# Altium footprint library En.PcbLib: 240 footprints (part 6 of 15)
Each footprint in its own frame and in the unit in brackets; x right, y up, seen from the top. Pads: shape width x height; smd on the part's side, far side on the other; paste and mask are expansions set on the pad; w line width, h text height; cw(c..) or ccw(c..) is an arc to the next point about the centre after c.
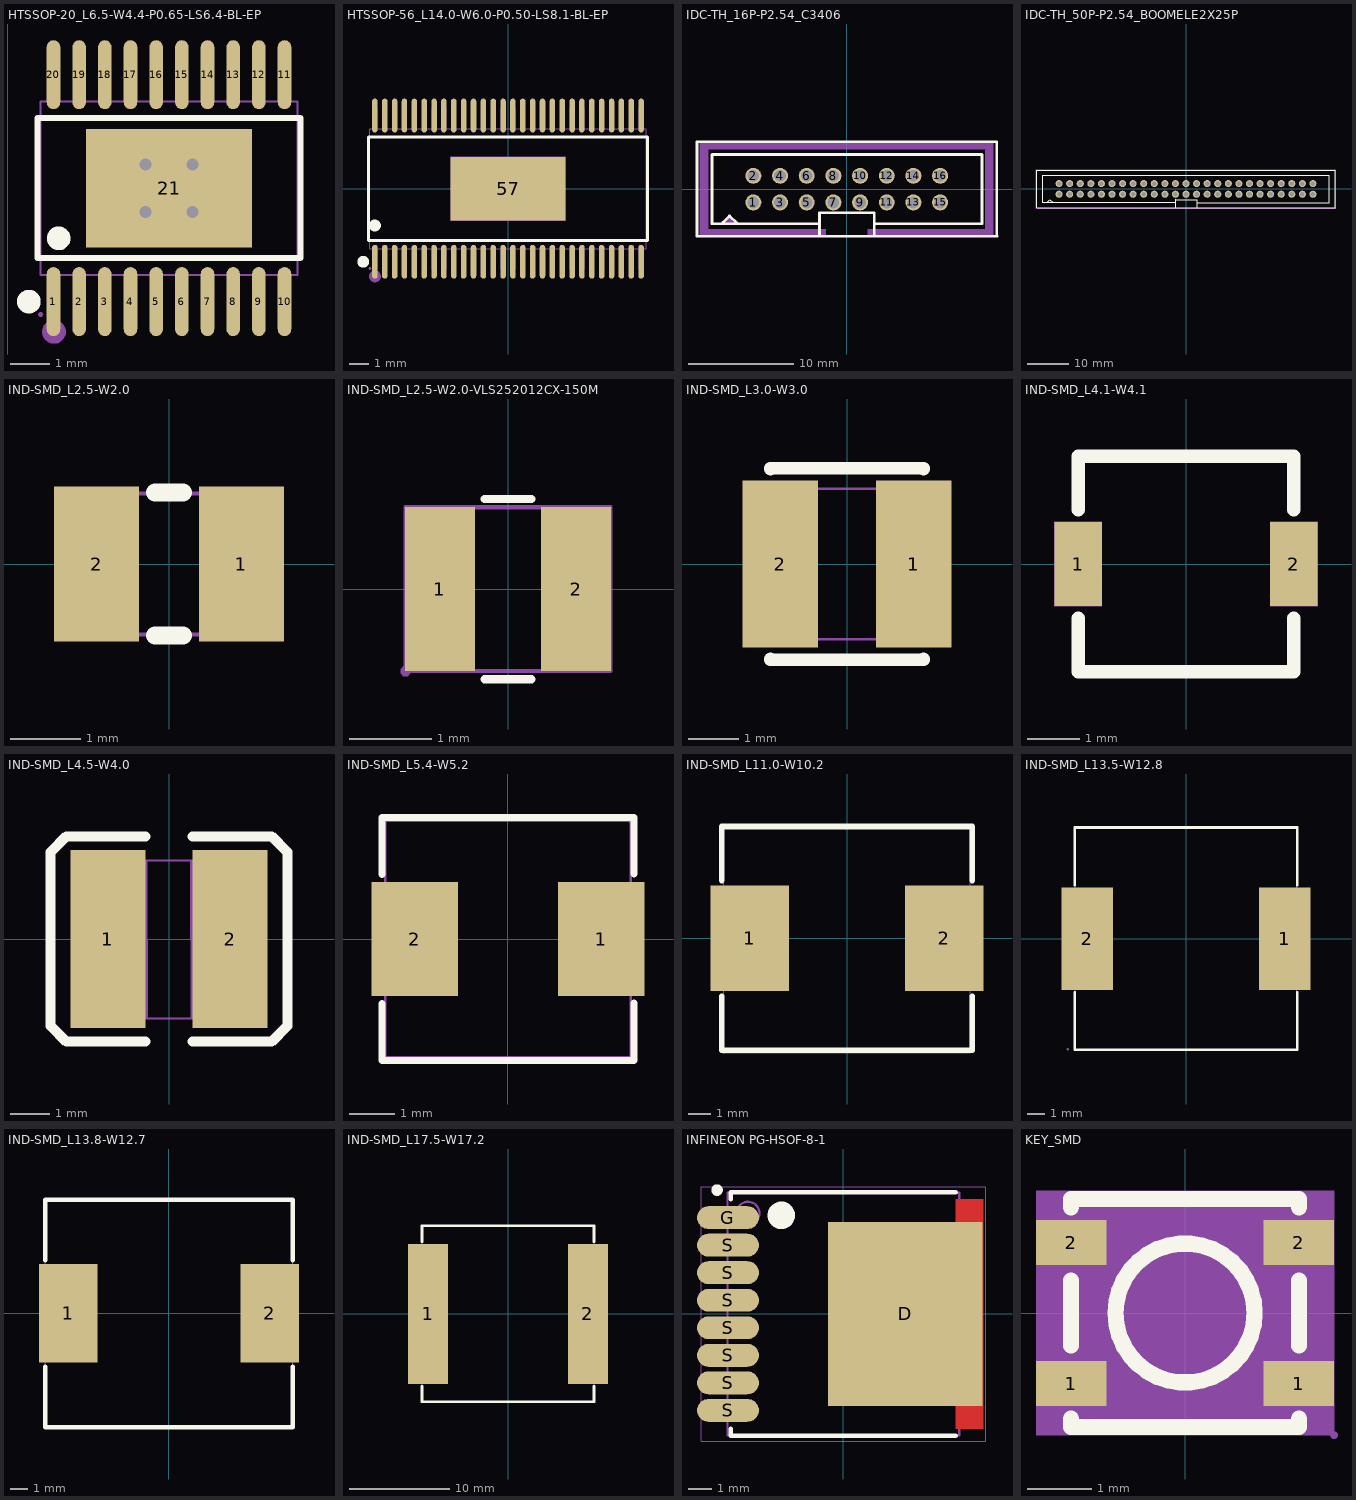
[diagram p5: the footprints below, top view; thin cyan lines are the x and y axes]

## HTSSOP-20_L6.5-W4.4-P0.65-LS6.4-BL-EP [mm]
pads (21):
  oval 0.343x1.747 smd: 1(1.155,-8.356) 2(1.805,-8.356) 3(2.455,-8.356) 4(3.105,-8.356) 5(3.755,-8.356) 6(4.405,-8.356) 7(5.055,-8.356) 8(5.705,-8.356) 9(6.355,-8.356) 10(7.005,-8.356) 11(7.005,-2.61) 12(6.355,-2.61) 13(5.705,-2.61) 14(5.055,-2.61) 15(4.405,-2.61) 16(3.755,-2.61) 17(3.105,-2.61) 18(2.455,-2.61) 19(1.805,-2.61) 20(1.155,-2.61)
  rect 4.2x3 smd: 21(4.08,-5.483)
via 4.68,-4.883 diameter 0.61 hole 0.305
via 3.48,-4.883 diameter 0.61 hole 0.305
via 3.48,-6.083 diameter 0.61 hole 0.305
via 4.68,-6.083 diameter 0.61 hole 0.305
Top Overlay:
  circle w0.3: c0.531,-8.356 r0.15
  circle w0.3: c1.286,-6.753 r0.15
  lines w0.152: 0.754,-7.254 0.754,-3.711 7.406,-3.711 7.406,-7.254 0.754,-7.254
Mechanical 6:
  circle w0.3: c1.168,-9.121 r0.15
Mechanical 15:
  drawing of 46 lines, arcs and shapes, not listed
3D body "User Library-HTSSOP20.sldprt": height 0.95, standoff -0.06, extent 0.838,-8.694 7.338,-2.28

## HTSSOP-56_L14.0-W6.0-P0.50-LS8.1-BL-EP [mm]
pads (57):
  oval 0.28x1.715 smd: 1(-6.75,-3.708) 2(-6.25,-3.708) 3(-5.75,-3.708) 4(-5.25,-3.708) 5(-4.75,-3.708) 6(-4.25,-3.708) 7(-3.75,-3.708) 8(-3.25,-3.708) 9(-2.75,-3.708) 10(-2.25,-3.708) 11(-1.75,-3.708) 12(-1.25,-3.708) 13(-0.75,-3.708) 14(-0.25,-3.708) 15(0.25,-3.708) 16(0.75,-3.708) 17(1.25,-3.708) 18(1.75,-3.708) 19(2.25,-3.708) 20(2.75,-3.708) 21(3.25,-3.708) 22(3.75,-3.708) 23(4.25,-3.708) 24(4.75,-3.708) 25(5.25,-3.708) 26(5.75,-3.708) 27(6.25,-3.708) 28(6.75,-3.708) 29(6.75,3.708) 30(6.25,3.708) 31(5.75,3.708) 32(5.25,3.708) 33(4.75,3.708) 34(4.25,3.708) 35(3.75,3.708) 36(3.25,3.708) 37(2.75,3.708) 38(2.25,3.708) 39(1.75,3.708) 40(1.25,3.708) 41(0.75,3.708) 42(0.25,3.708) 43(-0.25,3.708) 44(-0.75,3.708) 45(-1.25,3.708) 46(-1.75,3.708) 47(-2.25,3.708) 48(-2.75,3.708) 49(-3.25,3.708) 50(-3.75,3.708) 51(-4.25,3.708) 52(-4.75,3.708) 53(-5.25,3.708) 54(-5.75,3.708) 55(-6.25,3.708) 56(-6.75,3.708)
  rect 5.825x3.235 smd: 57(0,0)
Top Overlay:
  circle w0.3: c-6.75,-1.869 r0.15
  circle w0.3: c-7.342,-3.708 r0.15
  lines w0.152: -7.076,-2.621 -7.076,2.622 7.076,2.622 7.076,-2.621 -7.076,-2.621
Mechanical 6:
  circle w0.3: c-6.75,-4.45 r0.15
Mechanical 15:
  drawing of 118 lines, arcs and shapes, not listed
3D body "User Library-HTSSOP-56_leg_TSSOP56.SLDPRT": height 0.7, standoff 0, extent 6.09,-4.056 6.35,-3.056
3D body "User Library-HTSSOP-56_leg_TSSOP56.SLDPRT": height 0.7, standoff 0, extent 5.588,-4.056 5.848,-3.056
3D body "User Library-HTSSOP-56_leg_TSSOP56.SLDPRT": height 0.7, standoff 0, extent 5.087,-4.056 5.347,-3.056
3D body "User Library-HTSSOP-56_leg_TSSOP56.SLDPRT": height 0.7, standoff 0, extent 4.589,-4.056 4.849,-3.056
3D body "User Library-HTSSOP-56_leg_TSSOP56.SLDPRT": height 0.7, standoff 0, extent 4.09,-4.056 4.35,-3.056
3D body "User Library-HTSSOP-56_leg_TSSOP56.SLDPRT": height 0.7, standoff 0, extent 3.592,-4.056 3.852,-3.056
3D body "User Library-HTSSOP-56_leg_TSSOP56.SLDPRT": height 0.7, standoff 0, extent 3.093,-4.056 3.353,-3.056
3D body "User Library-HTSSOP-56_leg_TSSOP56.SLDPRT": height 0.7, standoff 0, extent 2.594,-4.056 2.854,-3.056
3D body "User Library-HTSSOP-56_leg_TSSOP56.SLDPRT": height 0.7, standoff 0, extent 2.096,-4.056 2.356,-3.056
3D body "User Library-HTSSOP-56_leg_TSSOP56.SLDPRT": height 0.7, standoff 0, extent 1.597,-4.056 1.857,-3.056
3D body "User Library-HTSSOP-56_leg_TSSOP56.SLDPRT": height 0.7, standoff 0, extent 1.099,-4.056 1.359,-3.056
3D body "User Library-HTSSOP-56_leg_TSSOP56.SLDPRT": height 0.7, standoff 0, extent 0.6,-4.056 0.86,-3.056
3D body "User Library-HTSSOP-56_leg_TSSOP56.SLDPRT": height 0.7, standoff 0, extent 0.102,-4.056 0.362,-3.056
3D body "User Library-HTSSOP-56_leg_TSSOP56.SLDPRT": height 0.7, standoff 0, extent -0.397,-4.056 -0.137,-3.056
3D body "User Library-HTSSOP-56_leg_TSSOP56.SLDPRT": height 0.7, standoff 0, extent -0.896,-4.056 -0.636,-3.056
3D body "User Library-HTSSOP-56_leg_TSSOP56.SLDPRT": height 0.7, standoff 0, extent -1.394,-4.056 -1.134,-3.056
3D body "User Library-HTSSOP-56_leg_TSSOP56.SLDPRT": height 0.7, standoff 0, extent -1.893,-4.056 -1.633,-3.056
3D body "User Library-HTSSOP-56_leg_TSSOP56.SLDPRT": height 0.7, standoff 0, extent -2.391,-4.056 -2.131,-3.056
3D body "User Library-HTSSOP-56_leg_TSSOP56.SLDPRT": height 0.7, standoff 0, extent -2.89,-4.056 -2.63,-3.056
3D body "User Library-HTSSOP-56_leg_TSSOP56.SLDPRT": height 0.7, standoff 0, extent -3.389,-4.056 -3.129,-3.056
3D body "User Library-HTSSOP-56_leg_TSSOP56.SLDPRT": height 0.7, standoff 0, extent -3.887,-4.056 -3.627,-3.056
3D body "User Library-HTSSOP-56_leg_TSSOP56.SLDPRT": height 0.7, standoff 0, extent -4.386,-4.056 -4.126,-3.056
3D body "User Library-HTSSOP-56_leg_TSSOP56.SLDPRT": height 0.7, standoff 0, extent -4.884,-4.056 -4.624,-3.056
3D body "User Library-HTSSOP-56_leg_TSSOP56.SLDPRT": height 0.7, standoff 0, extent -5.383,-4.056 -5.123,-3.056
3D body "User Library-HTSSOP-56_leg_TSSOP56.SLDPRT": height 0.7, standoff 0, extent -5.882,-4.056 -5.622,-3.056
3D body "User Library-HTSSOP-56_leg_TSSOP56.SLDPRT": height 0.7, standoff 0, extent -6.38,-4.056 -6.12,-3.056
3D body "User Library-HTSSOP-56_leg_TSSOP56.SLDPRT": height 0.7, standoff 0, extent -6.879,-4.056 -6.619,-3.056
3D body "User Library-HTSSOP-56_leg_TSSOP56.SLDPRT": height 0.7, standoff 0, extent 6.598,-4.056 6.858,-3.056
3D body "User Library-HTSSOP-56_leg_TSSOP56.SLDPRT": height 0.7, standoff 0, extent -6.35,3.056 -6.09,4.056
3D body "User Library-HTSSOP-56_leg_TSSOP56.SLDPRT": height 0.7, standoff 0, extent -5.848,3.056 -5.588,4.056
3D body "User Library-HTSSOP-56_leg_TSSOP56.SLDPRT": height 0.7, standoff 0, extent -5.347,3.056 -5.087,4.056
3D body "User Library-HTSSOP-56_leg_TSSOP56.SLDPRT": height 0.7, standoff 0, extent -4.849,3.056 -4.589,4.056
3D body "User Library-HTSSOP-56_leg_TSSOP56.SLDPRT": height 0.7, standoff 0, extent -4.35,3.056 -4.09,4.056
3D body "User Library-HTSSOP-56_leg_TSSOP56.SLDPRT": height 0.7, standoff 0, extent -3.852,3.056 -3.592,4.056
3D body "User Library-HTSSOP-56_leg_TSSOP56.SLDPRT": height 0.7, standoff 0, extent -3.353,3.056 -3.093,4.056
3D body "User Library-HTSSOP-56_leg_TSSOP56.SLDPRT": height 0.7, standoff 0, extent -2.854,3.056 -2.594,4.056
3D body "User Library-HTSSOP-56_leg_TSSOP56.SLDPRT": height 0.7, standoff 0, extent -2.356,3.056 -2.096,4.056
3D body "User Library-HTSSOP-56_leg_TSSOP56.SLDPRT": height 0.7, standoff 0, extent -1.857,3.056 -1.597,4.056
3D body "User Library-HTSSOP-56_leg_TSSOP56.SLDPRT": height 0.7, standoff 0, extent -1.359,3.056 -1.099,4.056
3D body "User Library-HTSSOP-56_leg_TSSOP56.SLDPRT": height 0.7, standoff 0, extent -0.86,3.056 -0.6,4.056
3D body "User Library-HTSSOP-56_leg_TSSOP56.SLDPRT": height 0.7, standoff 0, extent -0.362,3.056 -0.102,4.056
3D body "User Library-HTSSOP-56_leg_TSSOP56.SLDPRT": height 0.7, standoff 0, extent 0.137,3.056 0.397,4.056
3D body "User Library-HTSSOP-56_leg_TSSOP56.SLDPRT": height 0.7, standoff 0, extent 0.636,3.056 0.896,4.056
3D body "User Library-HTSSOP-56_leg_TSSOP56.SLDPRT": height 0.7, standoff 0, extent 1.134,3.056 1.394,4.056
3D body "User Library-HTSSOP-56_leg_TSSOP56.SLDPRT": height 0.7, standoff 0, extent 1.633,3.056 1.893,4.056
3D body "User Library-HTSSOP-56_leg_TSSOP56.SLDPRT": height 0.7, standoff 0, extent 2.131,3.056 2.391,4.056
3D body "User Library-HTSSOP-56_leg_TSSOP56.SLDPRT": height 0.7, standoff 0, extent 2.63,3.056 2.89,4.056
3D body "User Library-HTSSOP-56_leg_TSSOP56.SLDPRT": height 0.7, standoff 0, extent 3.129,3.056 3.389,4.056
3D body "User Library-HTSSOP-56_leg_TSSOP56.SLDPRT": height 0.7, standoff 0, extent 3.627,3.056 3.887,4.056
3D body "User Library-HTSSOP-56_leg_TSSOP56.SLDPRT": height 0.7, standoff 0, extent 4.126,3.056 4.386,4.056
3D body "User Library-HTSSOP-56_leg_TSSOP56.SLDPRT": height 0.7, standoff 0, extent 4.624,3.056 4.884,4.056
3D body "User Library-HTSSOP-56_leg_TSSOP56.SLDPRT": height 0.7, standoff 0, extent 5.123,3.056 5.383,4.056
3D body "User Library-HTSSOP-56_leg_TSSOP56.SLDPRT": height 0.7, standoff 0, extent 5.622,3.056 5.882,4.056
3D body "User Library-HTSSOP-56_leg_TSSOP56.SLDPRT": height 0.7, standoff 0, extent 6.12,3.056 6.38,4.056
3D body "User Library-HTSSOP-56_leg_TSSOP56.SLDPRT": height 0.7, standoff 0, extent 6.619,3.056 6.879,4.056
3D body "User Library-HTSSOP-56_leg_TSSOP56.SLDPRT": height 0.7, standoff 0, extent -6.858,3.056 -6.598,4.056
3D body "User Library-HTSSOP-56_Part_HTSSOP56.SLDPRT": height 0.99, standoff -0.01, extent -7,-3.1 7,3.1

## IDC-TH_16P-P2.54_C3406 [mil]
pads (16):
  round 60 hole 43.3: 1(-350,-50) 2(-350,50) 3(-250,-50) 4(-250,50) 5(-150,-50) 6(-150,50) 7(-50,-50) 8(-50,50) 9(50,-50) 10(50,50) 11(150,-50) 12(150,50) 13(250,-50) 14(250,50) 15(350,-50) 16(350,50)
Top Overlay:
  lines w10: -561,-176.33 -561,178 ; -559.9,178 562.2,178 ; -558.9,-177 562.99,-177 ; -505,-130 -103,-130 -102,-129 ; -505,-129 -505,129.66 ; -504.66,130 507.09,130 ; -464,-125 -439,-100 -412,-127 -412,-128 ; -102,-176 -102,-91 ; -102,-89 103,-89 103,-176 104,-177 ; 104,-131 104,-130 507,-130 ; 507,-129 507,129.66 ; 562,-176.33 562,178
Mechanical 6:
  region: -465,-130 -412,-130 -439,-100
  region: -78.74,-173.23 -549.61,-173.23 -549.61,173.23 549.61,173.23 549.61,-173.23 78.74,-173.23 78.74,-170.08 78.74,-157.87 78.74,-149.61 519.68,-149.61 519.68,149.61 -519.68,149.61 -519.68,-149.61 -78.74,-149.61
Mechanical 15:
  region: -547.25,-173.23 -547.27,-172.27 -548.65,-170.92 -550.57,-170.92 -551.95,-172.27 -551.97,-173.23 -551.95,-174.19 -550.57,-175.54 -548.65,-175.54 -547.27,-174.19
  region: 337.4,62.6 362.6,62.6 362.6,37.4 337.4,37.4
  region: 337.4,-37.4 362.6,-37.4 362.6,-62.6 337.4,-62.6
  region: 237.4,62.6 262.6,62.6 262.6,37.4 237.4,37.4
  region: 237.4,-37.4 262.6,-37.4 262.6,-62.6 237.4,-62.6
  region: 137.4,62.6 162.6,62.6 162.6,37.4 137.4,37.4
  region: 137.4,-37.4 162.6,-37.4 162.6,-62.6 137.4,-62.6
  region: 37.4,62.6 62.6,62.6 62.6,37.4 37.4,37.4
  region: 37.4,-37.4 62.6,-37.4 62.6,-62.6 37.4,-62.6
  region: -62.6,62.6 -37.4,62.6 -37.4,37.4 -62.6,37.4
  region: -62.6,-37.4 -37.4,-37.4 -37.4,-62.6 -62.6,-62.6
  region: -162.6,62.6 -137.4,62.6 -137.4,37.4 -162.6,37.4
  region: -162.6,-37.4 -137.4,-37.4 -137.4,-62.6 -162.6,-62.6
  region: -262.6,62.6 -237.4,62.6 -237.4,37.4 -262.6,37.4
  region: -262.6,-37.4 -237.4,-37.4 -237.4,-62.6 -262.6,-62.6
  region: -362.6,62.6 -337.4,62.6 -337.4,37.4 -362.6,37.4
  region: -362.6,-37.4 -337.4,-37.4 -337.4,-62.6 -362.6,-62.6
  lines w2: -549.61,-173.23 -549.61,173.23 549.61,173.23 549.61,-173.23 -549.61,-173.23
3D body "dc3-2.54-16pas.step": height 346.46, standoff -137.8, extent -547.19,-171.07 552.03,179.36

## IDC-TH_50P-P2.54_BOOMELE2X25P [mm]
pads (50):
  round 1.7 hole 1.1: 1(-30.48,-1.27) 2(-30.48,1.27) 3(-27.94,-1.27) 4(-27.94,1.27) 5(-25.4,-1.27) 6(-25.4,1.27) 7(-22.86,-1.27) 8(-22.86,1.27) 9(-20.32,-1.27) 10(-20.32,1.27) 11(-17.78,-1.27) 12(-17.78,1.27) 13(-15.24,-1.27) 14(-15.24,1.27) 15(-12.7,-1.27) 16(-12.7,1.27) 17(-10.16,-1.27) 18(-10.16,1.27) 19(-7.62,-1.27) 20(-7.62,1.27) 21(-5.08,-1.27) 22(-5.08,1.27) 23(-2.54,-1.27) 24(-2.54,1.27) 25(0,-1.27) 26(0,1.27) 27(2.54,-1.27) 28(2.54,1.27) 29(5.08,-1.27) 30(5.08,1.27) 31(7.62,-1.27) 32(7.62,1.27) 33(10.16,-1.27) 34(10.16,1.27) 35(12.7,-1.27) 36(12.7,1.27) 37(15.24,-1.27) 38(15.24,1.27) 39(17.78,-1.27) 40(17.78,1.27) 41(20.32,-1.27) 42(20.32,1.27) 43(22.86,-1.27) 44(22.86,1.27) 45(25.4,-1.27) 46(25.4,1.27) 47(27.94,-1.27) 48(27.94,1.27) 49(30.48,-1.27) 50(30.48,1.27)
Top Overlay:
  lines w0.254: -35.839,-4.479 -35.839,4.521 ; -35.811,4.521 35.789,4.521 ; -35.786,-4.496 35.814,-4.496 ; -34.442,-3.251 -2.565,-3.251 -2.54,-3.277 ; -34.417,-3.277 -34.417,3.293 ; -34.408,3.302 34.392,3.302 ; -33.376,-3.175 -32.741,-2.54 -32.055,-3.226 -32.055,-3.251 ; -2.515,-4.496 -2.515,-2.515 -2.515,-2.54 2.692,-2.54 2.692,-4.496 2.692,-4.394 ; 2.692,-3.277 34.366,-3.277 34.392,-3.277 34.392,3.293 ; 35.89,-4.479 35.89,4.521
Mechanical 15:
  drawing of 55 lines, arcs and shapes, not listed
3D body "2.54-2_25p简牛.step": height 8.75, standoff -3.65, extent -35.53,-4.191 35.59,4.71

## IND-SMD_L2.5-W2.0 [mm]
pads (2):
  rect 1.2x2.2 smd: 1(1.028,0) 2(-1.028,0)
Top Overlay:
  lines w0.254: -0.197,-1.016 0.197,-1.016 ; -0.197,1.016 0.197,1.016
Mechanical 15:
  region: -1.25,1 -0.45,1 -0.45,-1 -1.25,-1
  region: 0.45,1 1.25,1 1.25,-1 0.45,-1
  region: -1.16,-0.97 -1.161,-0.946 -1.196,-0.912 -1.244,-0.912 -1.279,-0.946 -1.28,-0.97 -1.279,-0.994 -1.244,-1.028 -1.196,-1.028 -1.161,-0.994
  lines w0.051: -1.25,-1 -1.25,1 1.25,1 1.25,-1 -1.25,-1
3D body "fhd252012s-2r2mt.step": height 1.2, standoff 0, extent -1.26,-1 1.26,1

## IND-SMD_L2.5-W2.0-VLS252012CX-150M [mm]
pads (2):
  rect 0.85x2 smd: 1(-0.83,0) 2(0.83,0)
Top Overlay:
  lines w0.102: -0.288,-1.1 0.287,-1.1 ; -0.288,1.1 0.287,1.1
Mechanical 15:
  region: -1.19,-1 -1.19,-0.975 -1.225,-0.94 -1.275,-0.94 -1.31,-0.975 -1.31,-1 -1.31,-1.025 -1.275,-1.06 -1.225,-1.06 -1.19,-1.025
  region: -1.23,1 -0.43,1 -0.43,-1 -1.23,-1
  region: 0.43,1 1.23,1 1.23,-1 0.43,-1
  lines w0.051: -1.25,-1 -1.25,1 1.25,1 1.25,-1 -1.25,-1
3D body "ftc252010s4r7mbca.step": height 1.21, standoff 0, extent -1.251,-1.001 1.251,1.001

## IND-SMD_L3.0-W3.0 [mm]
pads (2):
  rect 1.5x3.32 smd: 1(1.328,0) 2(-1.328,0)
Top Overlay:
  lines w0.254: -1.524,-1.891 -1.524,-1.905 1.524,-1.905 1.524,-1.891 ; -1.524,1.891 -1.524,1.905 1.524,1.905 1.524,1.891
Mechanical 15:
  region: -1.5,-1.45 -1.5,1.45 -0.75,1.45 -0.75,-1.45
  region: 1.5,-1.45 1.5,1.45 0.75,1.45 0.75,-1.45
  region: -1.44,-1.5 -1.44,-1.475 -1.475,-1.44 -1.525,-1.44 -1.56,-1.475 -1.56,-1.5 -1.56,-1.525 -1.525,-1.56 -1.475,-1.56 -1.44,-1.525
  lines w0.051: -1.5,-1.5 -1.5,1.5 1.5,1.5 1.5,-1.5 -1.5,-1.5
3D body "User Library-nr3015.SLDPRT": height 1.35, standoff -0.14, extent -1.5,-1.5 1.5,1.5

## IND-SMD_L4.1-W4.1 [mm]
pads (2):
  rect 0.9x1.6 smd: 1(-2.05,0) 2(2.05,0)
Top Overlay:
  lines w0.254: -2.05,-1.031 -2.05,-2.05 2.05,-2.05 2.05,-1.031 ; -2.05,1.031 -2.05,2.05 2.05,2.05 2.05,1.031
Mechanical 15:
  region: -2.5,0.8 -1.6,0.8 -1.6,-0.8 -2.5,-0.8
  region: 1.6,0.8 2.5,0.8 2.5,-0.8 1.6,-0.8
3D body "xr0420-220m.step": height 2.1, standoff 0, extent -2.2,-2.1 2.2,2.1

## IND-SMD_L4.5-W4.0 [mm]
pads (2):
  rect 1.9x4.5 smd: 1(-1.55,0) 2(1.55,0)
Top Overlay:
  lines w0.254: -0.599,-2.601 -2.601,-2.601 -3,-2.2 -3,2.2 -2.601,2.601 -0.599,2.601 ; 0.599,-2.601 2.601,-2.601 3,-2.2 3,2.2 2.601,2.601 0.599,2.601
Mechanical 15:
  drawing of 84 lines, arcs and shapes, not listed
3D body "cd43n-220m.step": height 3.21, standoff -0.01, extent -2.163,-2 2.161,2

## IND-SMD_L5.4-W5.2 [mm]
pads (2):
  rect 1.9x2.5 smd: 1(2.05,0) 2(-2.05,0)
Top Overlay:
  lines w0.152: -2.775,-1.42 -2.776,-2.676 2.776,-2.676 2.775,-1.41 ; -2.775,1.42 -2.776,2.676 2.776,2.676 2.775,1.43
Mechanical 15:
  region: -2.7,1.05 -1.5,1.05 -1.5,-1.05 -2.7,-1.05
  region: 1.5,1.05 2.7,1.05 2.7,-1.05 1.5,-1.05
  region: 2.76,2.6 2.759,2.624 2.724,2.658 2.676,2.658 2.641,2.624 2.64,2.6 2.641,2.576 2.676,2.542 2.724,2.542 2.759,2.576
  lines w0.051: -2.7,-2.6 2.7,-2.6 2.7,2.6 -2.7,2.6 -2.7,-2.6
3D body "xr0530-100m.step": height 3.1, standoff 0, extent -2.7,-2.6 2.7,2.6

## IND-SMD_L11.0-W10.2 [mm]
pads (2):
  rect 3.5x4.7 smd: 1(-4.35,0) 2(4.35,0)
Top Overlay:
  lines w0.254: -5.6,-2.581 -5.6,-5 5.6,-5 5.6,-2.581 ; -5.6,2.581 -5.6,5 5.6,5 5.6,2.581
Mechanical 15:
  region: 5.5,1.5 5.5,-1.5 3.5,-1.5 3.5,1.5
  region: -3.5,1.5 -3.5,-1.5 -5.5,-1.5 -5.5,1.5
  region: -5.44,-5.1 -5.441,-5.076 -5.476,-5.042 -5.524,-5.042 -5.559,-5.076 -5.56,-5.1 -5.559,-5.124 -5.524,-5.158 -5.476,-5.158 -5.441,-5.124
  lines w0.051: -5.5,-5.1 -5.5,5.1 5.5,5.1 5.5,-5.1 -5.5,-5.1
3D body "cxp1050-4r7m-ag(4.7uh).step": height 4, standoff -0.01, extent -5.5,-5.1 5.5,5.1

## IND-SMD_L13.5-W12.8 [mm]
pads (2):
  rect 2.924x5.82 smd: 1(5.628,0) 2(-5.628,0)
Top Overlay:
  lines w0.152: -6.326,-3.062 -6.326,-6.326 6.326,-6.326 6.326,-3.062 ; -6.326,3.062 -6.326,6.326 6.326,6.326 6.326,3.062
Mechanical 15:
  region: -6.665,-6.3 -6.666,-6.276 -6.701,-6.243 -6.749,-6.243 -6.784,-6.276 -6.785,-6.3 -6.784,-6.324 -6.749,-6.357 -6.701,-6.357 -6.666,-6.324
  region: -6.725,1.925 -4.75,1.925 -4.75,-1.925 -6.725,-1.925
  region: 4.75,1.925 6.725,1.925 6.725,-1.925 4.75,-1.925
  lines w0.051: -6.3,-6.3 -6.3,6.3 6.3,6.3 6.3,-6.3 -6.3,-6.3
3D body "cxp1250-4r7m-hg(4.7uh).step": height 6.6, standoff -0.05, extent -6.75,-6.4 6.75,6.4

## IND-SMD_L13.8-W12.7 [mm]
pads (2):
  rect 3.25x5.5 smd paste+0 mask+0.05: 1(-5.625,0) 2(5.625,0)
Top Overlay:
  lines w0.254: -6.9,-2.981 -6.9,-6.35 6.9,-6.35 6.9,-2.981 ; -6.9,2.981 -6.9,6.35 6.9,6.35 6.9,2.981
Mechanical 15:
  region: -6.84,-6.35 -6.841,-6.326 -6.876,-6.293 -6.924,-6.293 -6.959,-6.326 -6.96,-6.35 -6.959,-6.374 -6.924,-6.407 -6.876,-6.407 -6.841,-6.374
  region: 4.6,2.5 6.9,2.5 6.9,-2.5 4.6,-2.5
  region: -6.9,2.5 -4.6,2.5 -4.6,-2.5 -6.9,-2.5
  lines w0.051: -6.9,-6.35 -6.9,6.35 6.9,6.35 6.9,-6.35 -6.9,-6.35
3D body "yspi1365-470m.step": height 6.5, standoff 0, extent -6.9,-6.3 6.9,6.3

## IND-SMD_L17.5-W17.2 [mm]
pads (2):
  rect 4x14 smd: 1(-8,0) 2(8,0)
Top Overlay:
  lines w0.254: -8.6,-7.231 -8.6,-8.8 8.6,-8.8 8.6,-7.231 ; -8.6,7.231 -8.6,8.8 8.6,8.8 8.6,7.231
Mechanical 15:
  region: -8.6,5.97 -6.1,5.97 -6.1,-5.97 -8.6,-5.97
  region: 6.1,5.97 8.6,5.97 8.6,-5.97 6.1,-5.97
  region: -8.54,-8.75 -8.541,-8.726 -8.576,-8.692 -8.624,-8.693 -8.659,-8.726 -8.66,-8.75 -8.659,-8.774 -8.624,-8.808 -8.576,-8.808 -8.541,-8.774
  lines w0.051: -8.6,-8.75 8.6,-8.75 8.6,8.75 -8.6,8.75 -8.6,-8.75
3D body "smms1770-101m.step": height 6.8, standoff -0.2, extent -8.75,-8.75 8.75,8.75

## INFINEON PG-HSOF-8-1 [mm]
height 0.35
pads (9):
  rect 6.75x8 smd: D(2.7,0)
  oval 2.7x1 smd: G(-5.025,4.2) S(-5.025,-4.2) S(-5.025,-3) S(-5.025,-1.8) S(-5.025,-0.6) S(-5.025,0.6) S(-5.025,1.8) S(-5.025,3)
Top Layer:
  region: 4.9,5 6.1,5 6.1,-5 4.9,-5
Top Overlay:
  circle w0.25: c-5.5,5.4 r0.125
  circle w0.6: c-2.7,4.3 r0.3
  lines w0.2: -4.9,-5 -4.9,-5.3 4.9,-5.3 ; -4.9,5 -4.9,5.3 4.9,5.3
Mechanical 13:
  circle w0.1: c-4.15,4.39 r0.5
  lines w0.1: -5.05,-5.29 -5.05,5.29 5.05,5.29 5.05,-5.29 -5.05,-5.29
Mechanical 15:
  lines w0.05: -6.2,-5.55 -6.2,5.55 6.2,5.55 6.2,-5.55 -6.2,-5.55
  lines w0.1: -0.5,0 0.5,0 ; 0,-0.5 0,0.5
3D body "PG-HSOF-8-1.STEP": height 2.3, standoff 0, extent -5.815,-4.95 5.915,4.95

## KEY_SMD [mm]
height 3
pads (4):
  rect 1.1x0.7 smd: 1(-1.775,-1.1) 1(1.775,-1.1) 2(-1.775,1.1) 2(1.775,1.1)
Top Overlay:
  circle w0.254: c0,0 r1.085
  lines w0.254: -1.778,-1.651 -1.778,-1.778 1.778,-1.778 1.778,-1.651 ; -1.778,-0.508 -1.778,0.508 ; -1.778,1.651 -1.778,1.778 1.778,1.778 1.778,1.651 ; 1.778,-0.508 1.778,0.508
Mechanical 4:
  region: -2.325,1.905 2.325,1.905 2.325,-1.905 -2.325,-1.905
Mechanical 5:
  region: -2.325,1.45 -1.225,1.45 -1.225,0.75 -2.325,0.75
  region: 1.225,1.45 2.325,1.45 2.325,0.75 1.225,0.75
  region: -2.325,-0.75 -1.225,-0.75 -1.225,-1.45 -2.325,-1.45
  region: 1.225,-0.75 2.325,-0.75 2.325,-1.45 1.225,-1.45
Mechanical 6:
  circle w0.06: c2.325,-1.905 r0.03
Mechanical 15:
  lines w0.003: -0.011,0.478 0.04,0.529
3D body "User Library-SKSGAAE010 3_2x2_7x1_4-1.SLDPRT": height 1.6, standoff 0, extent -1.75,-1.35 1.75,1.35